# Altium footprint library SAMTEC THD.PcbLib: 161 footprints (part 1 of 12)
Each footprint in its own frame and in the unit in brackets; x right, y up, seen from the top. Pads: shape width x height; smd on the part's side, far side on the other; paste and mask are expansions set on the pad; w line width, h text height; cw(c..) or ccw(c..) is an arc to the next point about the centre after c.
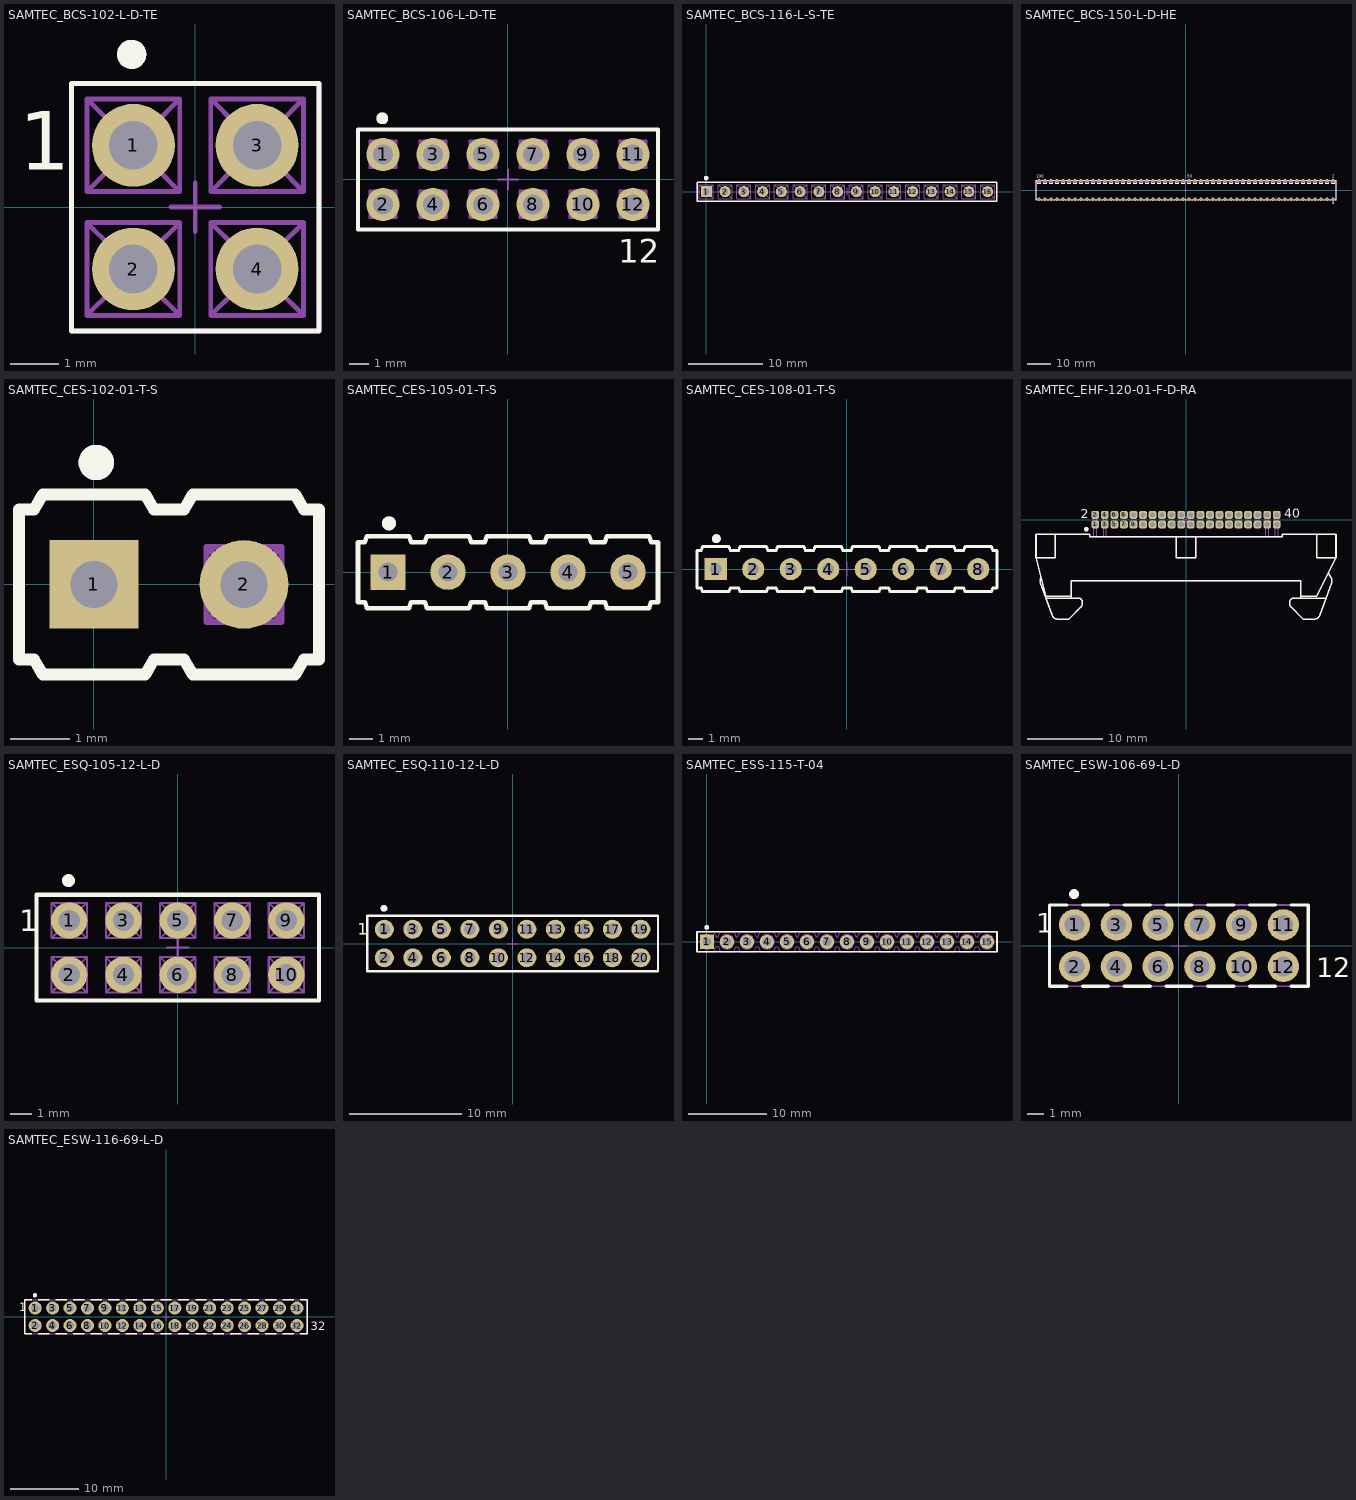
[diagram p0: the footprints below, top view; thin cyan lines are the x and y axes]

## SAMTEC_BCS-102-L-D-TE [mm] "4 Contacts - Pitch 2.54mm - Dual Row Horizontal Entry Socket"
height 7.37
pads (4):
  round 1.7 hole 1: 1(-1.27,1.27) 2(-1.27,-1.27) 3(1.27,1.27) 4(1.27,-1.27)
Top Overlay:
  circle w0.3: c-1.305,3.135 r0.15
  lines w0.1: -2.54,-2.54 -2.54,2.54 2.54,2.54 2.54,-2.54 -2.54,-2.54
  text "1" at -3.617,0.772 h1.2
Mechanical 8:
  lines w0.1: -1.77,-1.27 -1.27,-1.27 ; -1.77,1.27 -1.27,1.27 ; -1.27,-1.77 -1.27,-1.27 ; -1.27,-0.77 -1.27,-1.27 ; -1.27,0.77 -1.27,1.27 ; -1.27,1.77 -1.27,1.27 ; -0.77,-1.27 -1.27,-1.27 ; -0.77,1.27 -1.27,1.27 ; -0.5,0 0,0 ; 0,-0.5 0,0 ; 0,0.5 0,0 ; 0.5,0 0,0 ; 0.77,-1.27 1.27,-1.27 ; 0.77,1.27 1.27,1.27 ; 1.27,-1.77 1.27,-1.27 ; 1.27,0.77 1.27,1.27 ; 1.27,1.77 1.27,1.27 ; 1.77,-1.27 1.27,-1.27 ; 1.77,1.27 1.27,1.27
Mechanical 14:
  circle w0.3: c-1.305,3.135 r0.15
  lines w0.1: -1.71,-0.83 -1.714,-1.714 ; -1.71,1.71 -1.714,0.826 ; 0.83,-0.83 0.826,-1.714 ; 0.83,1.71 0.826,0.826 ; -2.222,-2.222 -1.714,-1.714 ; -2.222,-2.222 -2.222,-0.318 ; -2.222,-2.222 -0.318,-2.222 ; -2.222,-0.318 -1.714,-0.826 -0.826,-0.826 ; -2.222,-0.318 -0.318,-0.318 ; -2.222,0.318 -1.714,0.826 ; -2.222,0.318 -2.222,2.222 ; -2.222,0.318 -0.318,0.318 ; -2.222,2.222 -1.714,1.714 -0.826,1.714 ; -2.222,2.222 -0.318,2.222 ; -1.714,-1.714 -0.826,-1.714 ; -1.714,0.826 -0.826,0.826 ; -0.826,-1.714 -0.318,-2.222 ; -0.826,-1.714 -0.826,-0.826 ; -0.826,-0.826 -0.318,-0.318 ; -0.826,0.826 -0.318,0.318 ; -0.826,0.826 -0.826,1.714 ; -0.826,1.714 -0.318,2.222 ; -0.318,-2.222 -0.318,-0.318 ; -0.318,0.318 -0.318,2.222 ; 0.318,-2.222 0.826,-1.714 ; 0.318,-2.222 0.318,-0.318 ; 0.318,-2.222 2.222,-2.222 ; 0.318,-0.318 0.826,-0.826 1.714,-0.826 ; 0.318,-0.318 2.222,-0.318 ; 0.318,0.318 0.826,0.826 ; 0.318,0.318 0.318,2.222 ; 0.318,0.318 2.222,0.318 ; 0.318,2.222 0.826,1.714 1.714,1.714 ; 0.318,2.222 2.222,2.222 ; 0.826,-1.714 1.714,-1.714 ; 0.826,0.826 1.714,0.826 ; 1.714,-1.714 2.222,-2.222 ; 1.714,-1.714 1.714,-0.826 ; 1.714,-0.826 2.222,-0.318 ; 1.714,0.826 2.222,0.318 ; 1.714,0.826 1.714,1.714 ; 1.714,1.714 2.222,2.222 ; 2.222,-2.222 2.222,-0.318 ; 2.222,0.318 2.222,2.222 ; -2.54,-2.54 -2.54,2.54 2.54,2.54 2.54,-2.54 -2.54,-2.54
  text "1" at -3.617,0.772 h1.2
3D body "SAMTEC_BCS-102-L-D-TE.stp": height 7.37, standoff -3.1, extent -2.54,-2.54 2.54,2.54

## SAMTEC_BCS-106-L-D-TE [mm] "12 Contacts - Pitch 2.54mm - Dual Row Top Entry Socket"
height 7.37
pads (12):
  round 1.7 hole 1: 1(-6.35,1.27) 2(-6.35,-1.27) 3(-3.81,1.27) 4(-3.81,-1.27) 5(-1.27,1.27) 6(-1.27,-1.27) 7(1.27,1.27) 8(1.27,-1.27) 9(3.81,1.27) 10(3.81,-1.27) 11(6.35,1.27) 12(6.35,-1.27)
Top Overlay:
  circle w0.3: c-6.387,3.108 r0.15
  lines w0.2: -7.62,-2.54 7.62,-2.54 7.62,2.54 -7.62,2.54 -7.62,-2.54
  text "12" at 5.6,-4.225 h1.2
Mechanical 8:
  lines w0.1: -6.85,-1.27 -6.35,-1.27 ; -6.85,1.27 -6.35,1.27 ; -6.35,-1.77 -6.35,-1.27 ; -6.35,-0.77 -6.35,-1.27 ; -6.35,0.77 -6.35,1.27 ; -6.35,1.77 -6.35,1.27 ; -5.85,-1.27 -6.35,-1.27 ; -5.85,1.27 -6.35,1.27 ; -4.31,-1.27 -3.81,-1.27 ; -4.31,1.27 -3.81,1.27 ; -3.81,-1.77 -3.81,-1.27 ; -3.81,-0.77 -3.81,-1.27 ; -3.81,0.77 -3.81,1.27 ; -3.81,1.77 -3.81,1.27 ; -3.31,-1.27 -3.81,-1.27 ; -3.31,1.27 -3.81,1.27 ; -1.77,-1.27 -1.27,-1.27 ; -1.77,1.27 -1.27,1.27 ; -1.27,-1.77 -1.27,-1.27 ; -1.27,-0.77 -1.27,-1.27 ; -1.27,0.77 -1.27,1.27 ; -1.27,1.77 -1.27,1.27 ; -0.77,-1.27 -1.27,-1.27 ; -0.77,1.27 -1.27,1.27 ; -0.5,0 0,0 ; 0,-0.5 0,0 ; 0,0.5 0,0 ; 0.5,0 0,0 ; 0.77,-1.27 1.27,-1.27 ; 0.77,1.27 1.27,1.27 ; 1.27,-1.77 1.27,-1.27 ; 1.27,-0.77 1.27,-1.27 ; 1.27,0.77 1.27,1.27 ; 1.27,1.77 1.27,1.27 ; 1.77,-1.27 1.27,-1.27 ; 1.77,1.27 1.27,1.27 ; 3.31,-1.27 3.81,-1.27 ; 3.31,1.27 3.81,1.27 ; 3.81,-1.77 3.81,-1.27 ; 3.81,-0.77 3.81,-1.27 ; 3.81,0.77 3.81,1.27 ; 3.81,1.77 3.81,1.27 ; 4.31,-1.27 3.81,-1.27 ; 4.31,1.27 3.81,1.27 ; 5.85,-1.27 6.35,-1.27 ; 5.85,1.27 6.35,1.27 ; 6.35,-1.77 6.35,-1.27 ; 6.35,-0.77 6.35,-1.27 ; 6.35,0.77 6.35,1.27 ; 6.35,1.77 6.35,1.27 ; 6.85,-1.27 6.35,-1.27 ; 6.85,1.27 6.35,1.27
Mechanical 14:
  circle w0.3: c-6.387,3.108 r0.15
  lines w0.1: -7.048,-1.968 -5.651,-1.968 ; -7.048,-1.968 -7.048,-0.572 ; -7.048,-1.968 -6.794,-1.714 ; -7.048,-0.572 -5.651,-0.572 ; -7.048,-0.572 -6.794,-0.826 ; -7.048,0.572 -5.651,0.572 ; -7.048,0.572 -7.048,1.968 ; -7.048,0.572 -6.794,0.826 ; -7.048,1.968 -5.651,1.968 ; -7.048,1.968 -6.794,1.714 ; -6.794,-1.714 -6.794,-0.826 ; -6.794,-1.714 -5.905,-1.714 ; -6.794,-0.826 -5.905,-0.826 ; -6.794,0.826 -6.794,1.714 ; -6.794,0.826 -5.905,0.826 ; -6.794,1.714 -5.905,1.714 ; -5.905,-1.714 -5.905,-0.826 ; -5.905,-1.714 -5.651,-1.968 ; -5.905,-0.826 -5.651,-0.572 ; -5.905,0.826 -5.905,1.714 ; -5.905,0.826 -5.651,0.572 ; -5.905,1.714 -5.651,1.968 ; -5.651,-1.968 -5.651,-0.572 ; -5.651,0.572 -5.651,1.968 ; -4.508,-1.968 -3.111,-1.968 ; -4.508,-1.968 -4.508,-0.572 ; -4.508,-1.968 -4.254,-1.714 ; -4.508,-0.572 -3.111,-0.572 ; -4.508,-0.572 -4.254,-0.826 ; -4.508,0.572 -3.111,0.572 ; -4.508,0.572 -4.508,1.968 ; -4.508,0.572 -4.254,0.826 ; -4.508,1.968 -3.111,1.968 ; -4.508,1.968 -4.254,1.714 ; -4.254,-1.714 -4.254,-0.826 ; -4.254,-1.714 -3.365,-1.714 ; -4.254,-0.826 -3.365,-0.826 ; -4.254,0.826 -4.254,1.714 ; -4.254,0.826 -3.365,0.826 ; -4.254,1.714 -3.365,1.714 ; -3.365,-1.714 -3.365,-0.826 ; -3.365,-1.714 -3.111,-1.968 ; -3.365,-0.826 -3.111,-0.572 ; -3.365,0.826 -3.365,1.714 ; -3.365,0.826 -3.111,0.572 ; -3.365,1.714 -3.111,1.968 ; -3.111,-1.968 -3.111,-0.572 ; -3.111,0.572 -3.111,1.968 ; -1.968,-1.968 -0.571,-1.968 ; -1.968,-1.968 -1.968,-0.572 ; -1.968,-1.968 -1.714,-1.714 ; -1.968,-0.572 -0.571,-0.572 ; -1.968,-0.572 -1.714,-0.826 ; -1.968,0.572 -0.571,0.572 ; -1.968,0.572 -1.968,1.968 ; -1.968,0.572 -1.714,0.826 ; -1.968,1.968 -0.571,1.968 ; -1.968,1.968 -1.714,1.714 ; -1.714,-1.714 -1.714,-0.826 ; -1.714,-1.714 -0.825,-1.714 ; -1.714,-0.826 -0.825,-0.826 ; -1.714,0.826 -1.714,1.714 ; -1.714,0.826 -0.825,0.826 ; -1.714,1.714 -0.825,1.714 ; -0.825,-1.714 -0.825,-0.826 ; -0.825,-1.714 -0.571,-1.968 ; -0.825,-0.826 -0.571,-0.572 ; -0.825,0.826 -0.825,1.714 ; -0.825,0.826 -0.571,0.572 ; -0.825,1.714 -0.571,1.968 ; -0.571,-1.968 -0.571,-0.572 ; -0.571,0.572 -0.571,1.968 ; 0.572,-1.968 1.969,-1.968 ; 0.572,-1.968 0.572,-0.572 ; 0.572,-1.968 0.826,-1.714 ; 0.572,-0.572 1.969,-0.572 ; 0.572,-0.572 0.826,-0.826 ; 0.572,0.572 1.969,0.572 ; 0.572,0.572 0.572,1.968 ; 0.572,0.572 0.826,0.826 ; 0.572,1.968 1.969,1.968 ; 0.572,1.968 0.826,1.714 ; 0.826,-1.714 0.826,-0.826 ; 0.826,-1.714 1.715,-1.714 ; 0.826,-0.826 1.715,-0.826 ; 0.826,0.826 0.826,1.714 ; 0.826,0.826 1.715,0.826 ; 0.826,1.714 1.715,1.714 ; 1.715,-1.714 1.715,-0.826 ; 1.715,-1.714 1.969,-1.968 ; 1.715,-0.826 1.969,-0.572 ; 1.715,0.826 1.715,1.714 ; 1.715,0.826 1.969,0.572 ; 1.715,1.714 1.969,1.968 ; 1.969,-1.968 1.969,-0.572 ; 1.969,0.572 1.969,1.968 ; 3.112,-1.968 4.509,-1.968 ; 3.112,-1.968 3.112,-0.572 ; 3.112,-1.968 3.366,-1.714 ; 3.112,-0.572 4.509,-0.572 ; 3.112,-0.572 3.366,-0.826 ; 3.112,0.572 4.509,0.572 ; 3.112,0.572 3.112,1.968 ; 3.112,0.572 3.366,0.826 ; 3.112,1.968 4.509,1.968 ; 3.112,1.968 3.366,1.714 ; 3.366,-1.714 3.366,-0.826 ; 3.366,-1.714 4.255,-1.714 ; 3.366,-0.826 4.255,-0.826 ; 3.366,0.826 3.366,1.714 ; 3.366,0.826 4.255,0.826 ; 3.366,1.714 4.255,1.714 ; 4.255,-1.714 4.255,-0.826 ; 4.255,-1.714 4.509,-1.968 ; 4.255,-0.826 4.509,-0.572 ; 4.255,0.826 4.255,1.714 ; 4.255,0.826 4.509,0.572 ; 4.255,1.714 4.509,1.968 ; 4.509,-1.968 4.509,-0.572 ; 4.509,0.572 4.509,1.968 ; 5.652,-1.968 7.049,-1.968 ; 5.652,-1.968 5.652,-0.572 ; 5.652,-1.968 5.906,-1.714 ; 5.652,-0.572 7.049,-0.572 ; 5.652,-0.572 5.906,-0.826 ; 5.652,0.572 7.049,0.572 ; 5.652,0.572 5.652,1.968 ; 5.652,0.572 5.906,0.826 ; 5.652,1.968 7.049,1.968 ; 5.652,1.968 5.906,1.714 ; 5.906,-1.714 5.906,-0.826 ; 5.906,-1.714 6.795,-1.714 ; 5.906,-0.826 6.795,-0.826 ; 5.906,0.826 5.906,1.714 ; 5.906,0.826 6.795,0.826 ; 5.906,1.714 6.795,1.714 ; 6.795,-1.714 6.795,-0.826 ; 6.795,-1.714 7.049,-1.968 ; 6.795,-0.826 7.049,-0.572 ; 6.795,0.826 6.795,1.714 ; 6.795,0.826 7.049,0.572 ; 6.795,1.714 7.049,1.968 ; 7.049,-1.968 7.049,-0.572 ; 7.049,0.572 7.049,1.968 ; -7.62,-2.54 7.62,-2.54 7.62,2.54 -7.62,2.54 -7.62,-2.54
  text "12" at 5.6,-4.225 h1.2
3D body "SAMTEC_BCS-106-L-D-TE.stp": height 7.37, standoff -3.1, extent -7.62,-2.54 7.62,2.54

## SAMTEC_BCS-116-L-S-TE [mm] "16 Contacts - Pitch 2.54mm - Single Row Vertical Entry Socket"
height 7.37
pads (16):
  rect 1.5x1.5 hole 0.8: 1(0,0)
  round 1.5 hole 0.8: 2(2.54,0) 3(5.08,0) 4(7.62,0) 5(10.16,0) 6(12.7,0) 7(15.24,0) 8(17.78,0) 9(20.32,0) 10(22.86,0) 11(25.4,0) 12(27.94,0) 13(30.48,0) 14(33.02,0) 15(35.56,0) 16(38.1,0)
Top Overlay:
  circle w0.3: c-0.037,1.838 r0.15
  lines w0.2: -1.27,-1.27 -1.27,1.27 39.37,1.27 39.37,-1.27 -1.27,-1.27
Mechanical 8:
  lines w0.1: -0.5,0 0,0 ; 0,-0.5 0,0 ; 0,0.5 0,0 ; 0.5,0 0,0 ; 2.04,0 2.54,0 ; 2.54,-0.5 2.54,0 ; 2.54,0.5 2.54,0 ; 3.04,0 2.54,0 ; 4.58,0 5.08,0 ; 5.08,-0.5 5.08,0 ; 5.08,0.5 5.08,0 ; 5.58,0 5.08,0 ; 7.12,0 7.62,0 ; 7.62,-0.5 7.62,0 ; 7.62,0.5 7.62,0 ; 8.12,0 7.62,0 ; 9.66,0 10.16,0 ; 10.16,-0.5 10.16,0 ; 10.16,0.5 10.16,0 ; 10.66,0 10.16,0 ; 12.2,0 12.7,0 ; 12.7,-0.5 12.7,0 ; 12.7,0.5 12.7,0 ; 13.2,0 12.7,0 ; 14.74,0 15.24,0 ; 15.24,-0.5 15.24,0 ; 15.24,0.5 15.24,0 ; 15.74,0 15.24,0 ; 17.28,0 17.78,0 ; 17.78,-0.5 17.78,0 ; 17.78,0.5 17.78,0 ; 18.28,0 17.78,0 ; 18.55,0 19.05,0 ; 19.05,-0.5 19.05,0 ; 19.05,0.5 19.05,0 ; 19.55,0 19.05,0 ; 19.82,0 20.32,0 ; 20.32,-0.5 20.32,0 ; 20.32,0.5 20.32,0 ; 20.82,0 20.32,0 ; 22.36,0 22.86,0 ; 22.86,-0.5 22.86,0 ; 22.86,0.5 22.86,0 ; 23.36,0 22.86,0 ; 24.9,0 25.4,0 ; 25.4,-0.5 25.4,0 ; 25.4,0.5 25.4,0 ; 25.9,0 25.4,0 ; 27.44,0 27.94,0 ; 27.94,-0.5 27.94,0 ; 27.94,0.5 27.94,0 ; 28.44,0 27.94,0 ; 29.98,0 30.48,0 ; 30.48,-0.5 30.48,0 ; 30.48,0.5 30.48,0 ; 30.98,0 30.48,0 ; 32.52,0 33.02,0 ; 33.02,-0.5 33.02,0 ; 33.02,0.5 33.02,0 ; 33.52,0 33.02,0 ; 35.06,0 35.56,0 ; 35.56,-0.5 35.56,0 ; 35.56,0.5 35.56,0 ; 36.06,0 35.56,0 ; 37.6,0 38.1,0 ; 38.1,-0.5 38.1,0 ; 38.1,0.5 38.1,0 ; 38.6,0 38.1,0
Mechanical 14:
  drawing of 181 lines, arcs and shapes, not listed
3D body "SAMTEC_BCS-116-L-S-TE.stp": height 7.37, standoff -3.1, extent -1.27,-1.27 39.37,1.27

## SAMTEC_BCS-150-L-D-HE [mm] "100 Contacts - Pitch 2.54mm - Dual Row Horizontal Entry Socket"
height 5.72
pads (100):
  round 1.5 hole 0.8: 1(62.23,-3.935) 2(62.23,3.935) 3(59.69,-3.935) 4(59.69,3.935) 5(57.15,-3.935) 6(57.15,3.935) 7(54.61,-3.935) 8(54.61,3.935) 9(52.07,-3.935) 10(52.07,3.935) 11(49.53,-3.935) 12(49.53,3.935) 13(46.99,-3.935) 14(46.99,3.935) 15(44.45,-3.935) 16(44.45,3.935) 17(41.91,-3.935) 18(41.91,3.935) 19(39.37,-3.935) 20(39.37,3.935) 21(36.83,-3.935) 22(36.83,3.935) 23(34.29,-3.935) 24(34.29,3.935) 25(31.75,-3.935) 26(31.75,3.935) 27(29.21,-3.935) 28(29.21,3.935) 29(26.67,-3.935) 30(26.67,3.935) 31(24.13,-3.935) 32(24.13,3.935) 33(21.59,-3.935) 34(21.59,3.935) 35(19.05,-3.935) 36(19.05,3.935) 37(16.51,-3.935) 38(16.51,3.935) 39(13.97,-3.935) 40(13.97,3.935) 41(11.43,-3.935) 42(11.43,3.935) 43(8.89,-3.935) 44(8.89,3.935) 45(6.35,-3.935) 46(6.35,3.935) 47(3.81,-3.935) 48(3.81,3.935) 49(1.27,-3.935) 50(1.27,3.935) 51(-1.27,-3.935) 52(-1.27,3.935) 53(-3.81,-3.935) 54(-3.81,3.935) 55(-6.35,-3.935) 56(-6.35,3.935) 57(-8.89,-3.935) 58(-8.89,3.935) 59(-11.43,-3.935) 60(-11.43,3.935) 61(-13.97,-3.935) 62(-13.97,3.935) 63(-16.51,-3.935) 64(-16.51,3.935) 65(-19.05,-3.935) 66(-19.05,3.935) 67(-21.59,-3.935) 68(-21.59,3.935) 69(-24.13,-3.935) 70(-24.13,3.935) 71(-26.67,-3.935) 72(-26.67,3.935) 73(-29.21,-3.935) 74(-29.21,3.935) 75(-31.75,-3.935) 76(-31.75,3.935) 77(-34.29,-3.935) 78(-34.29,3.935) 79(-36.83,-3.935) 80(-36.83,3.935) 81(-39.37,-3.935) 82(-39.37,3.935) 83(-41.91,-3.935) 84(-41.91,3.935) 85(-44.45,-3.935) 86(-44.45,3.935) 87(-46.99,-3.935) 88(-46.99,3.935) 89(-49.53,-3.935) 90(-49.53,3.935) 91(-52.07,-3.935) 92(-52.07,3.935) 93(-54.61,-3.935) 94(-54.61,3.935) 95(-57.15,-3.935) 96(-57.15,3.935) 97(-59.69,-3.935) 98(-59.69,3.935) 99(-62.23,-3.935) 100(-62.23,3.935)
Top Overlay:
  drawing of 257 lines, arcs and shapes, not listed
  text "50" at 0.5,5.175 h1.2
  text "100" at -63.375,5.136 h1.2
  text "2" at 61.86,5.175 h1.2
Mechanical 8:
  drawing of 405 lines, arcs and shapes, not listed
Mechanical 14:
  drawing of 308 lines, arcs and shapes, not listed
  text "50" at 0.5,5.175 h1.2
  text "100" at -63.375,5.136 h1.2
  text "2" at 61.86,5.175 h1.2
3D body "SAMTEC_BCS-150-L-D-HE.stp": height 5.72, standoff -3.1, extent -63.5,-4.064 63.5,4.064

## SAMTEC_CES-102-01-T-S [mm] "2 Contacts - Pitch 2.54mm - Single Row Through Mount Straigh Socket (Lead Length 3.25mm)"
height 4.57
pads (2):
  rect 1.5x1.5 hole 0.8: 1(0,0)
  round 1.5 hole 0.8: 2(2.54,0)
Top Overlay:
  circle w0.3: c0.04,2.065 r0.15
  lines w0.2: -1.27,-1.269 -1.27,1.271 -1.016,1.271 -0.869,1.525 0.869,1.525 1.016,1.271 1.27,1.271 1.524,1.271 1.671,1.525 3.409,1.525 3.556,1.271 3.81,1.271 3.81,-1.269 3.556,-1.269 3.409,-1.523 1.671,-1.523 1.524,-1.269 1.27,-1.269 1.016,-1.269 0.869,-1.523 -0.869,-1.523 -1.016,-1.269 -1.27,-1.269
Mechanical 8:
  lines w0.1: -0.5,0 0,0 ; 0,-0.5 0,0 ; 0,0.5 0,0 ; 0.5,0 0,0 ; 2.04,0 2.54,0 ; 2.54,-0.5 2.54,0 ; 2.54,0.5 2.54,0 ; 3.04,0 2.54,0
Mechanical 14:
  circle w0.3: c0.04,2.065 r0.15
  lines w0.1: -0.635,-0.634 0.635,-0.634 ; -0.635,-0.634 -0.635,0.636 ; -0.635,-0.634 -0.381,-0.38 ; -0.635,0.636 0.635,0.636 ; -0.635,0.636 -0.381,0.382 ; -0.381,-0.38 -0.381,0.382 ; -0.381,-0.38 0.381,-0.38 ; -0.381,0.382 0.381,0.382 ; 0.381,-0.38 0.635,-0.634 ; 0.381,-0.38 0.381,0.382 ; 0.381,0.382 0.635,0.636 ; 0.635,-0.634 0.635,0.636 ; 1.905,-0.634 2.159,-0.38 ; 1.905,-0.634 3.175,-0.634 ; 1.905,-0.634 1.905,0.636 ; 1.905,0.636 2.159,0.382 ; 1.905,0.636 3.175,0.636 ; 2.159,-0.38 2.159,0.382 ; 2.159,-0.38 2.921,-0.38 ; 2.159,0.382 2.921,0.382 ; 2.921,-0.38 3.175,-0.634 ; 2.921,-0.38 2.921,0.382 ; 2.921,0.382 3.175,0.636 ; 3.175,-0.634 3.175,0.636 ; -1.27,-1.269 -1.27,1.271 -1.016,1.271 -0.869,1.525 0.869,1.525 1.016,1.271 1.27,1.271 1.524,1.271 1.671,1.525 3.409,1.525 3.556,1.271 3.81,1.271 3.81,-1.269 3.556,-1.269 3.409,-1.523 1.671,-1.523 1.524,-1.269 1.27,-1.269 1.016,-1.269 0.869,-1.523 -0.869,-1.523 -1.016,-1.269 -1.27,-1.269
3D body "SAMTEC_CES-102-01-T-S.stp": height 5.08, standoff -5.08, extent -1.27,-1.525 3.81,1.525

## SAMTEC_CES-105-01-T-S [mm] "5 Contacts - Pitch 2.54mm - Single Row Through Mount Straigh Socket (Lead Length 3.25mm)"
height 5.08
pads (5):
  rect 1.5x1.5 hole 0.8: 1(-5.08,0)
  round 1.5 hole 0.8: 2(-2.54,0) 3(0,0) 4(2.54,0) 5(5.08,0)
Top Overlay:
  circle w0.3: c-5.04,2.065 r0.15
  lines w0.2: -6.35,-1.27 -6.061,-1.27 -5.969,-1.524 -4.191,-1.524 -4.098,-1.27 -3.521,-1.27 -3.429,-1.524 -1.651,-1.524 -1.558,-1.27 -0.981,-1.27 -0.889,-1.524 0.889,-1.524 0.982,-1.27 1.559,-1.27 1.651,-1.524 3.429,-1.524 3.522,-1.27 4.099,-1.27 4.191,-1.524 5.969,-1.524 6.062,-1.27 6.35,-1.27 6.35,1.27 6.062,1.27 5.969,1.524 4.191,1.524 4.099,1.27 3.522,1.27 3.429,1.524 1.651,1.524 1.559,1.27 0.982,1.27 0.889,1.524 -0.889,1.524 -0.981,1.27 -1.558,1.27 -1.651,1.524 -3.429,1.524 -3.521,1.27 -4.098,1.27 -4.191,1.524 -5.969,1.524 -6.061,1.27 -6.35,1.27 -6.35,-1.27
Mechanical 8:
  lines w0.05: -5.58,0 -5.08,0 ; -5.08,-0.5 -5.08,0 ; -5.08,0.5 -5.08,0 ; -4.58,0 -5.08,0 ; -3.04,0 -2.54,0 ; -2.54,-0.5 -2.54,0 ; -2.54,0.5 -2.54,0 ; -2.04,0 -2.54,0 ; -0.5,0 0,0 ; 0,-0.5 0,0 ; 0,0.5 0,0 ; 0.5,0 0,0 ; 2.04,0 2.54,0 ; 2.54,-0.5 2.54,0 ; 2.54,0.5 2.54,0 ; 3.04,0 2.54,0 ; 4.58,0 5.08,0 ; 5.08,-0.5 5.08,0 ; 5.08,0.5 5.08,0 ; 5.58,0 5.08,0
Mechanical 14:
  circle w0.3: c-5.04,2.065 r0.15
  lines w0.1: 6.35,-1.27 6.062,-1.27 5.969,-1.524 4.191,-1.524 4.099,-1.27 3.522,-1.27 3.429,-1.524 1.651,-1.524 1.559,-1.27 0.982,-1.27 0.889,-1.524 -0.889,-1.524 -0.981,-1.27 -1.558,-1.27 -1.651,-1.524 -3.429,-1.524 -3.521,-1.27 -4.098,-1.27 -4.191,-1.524 -5.969,-1.524 -6.061,-1.27 -6.35,-1.27 -6.35,1.27 -6.061,1.27 -5.969,1.524 -4.191,1.524 -4.098,1.27 -3.521,1.27 -3.429,1.524 -1.651,1.524 -1.558,1.27 -0.981,1.27 -0.889,1.524 0.889,1.524 0.982,1.27 1.559,1.27 1.651,1.524 3.429,1.524 3.522,1.27 4.099,1.27 4.191,1.524 5.969,1.524 6.062,1.27 6.35,1.27 ; -5.436,-0.356 -5.436,0.356 -4.724,0.356 -4.724,-0.356 -5.436,-0.356 ; -2.896,-0.356 -2.896,0.356 -2.184,0.356 -2.184,-0.356 -2.896,-0.356 ; -0.356,-0.356 -0.356,0.356 0.356,0.356 0.356,-0.356 -0.356,-0.356 ; 2.184,-0.356 2.184,0.356 2.896,0.356 2.896,-0.356 2.184,-0.356 ; 4.724,-0.356 4.724,0.356 5.436,0.356 5.436,-0.356 4.724,-0.356
3D body "SAMTEC_CES-105-01-T-S.stp": height 5.08, standoff -3.25, extent -6.35,-1.524 6.35,1.524

## SAMTEC_CES-108-01-T-S [mm] "8 Contacts - Pitch 2.54mm - Single Row Through Mount Straigh Socket (Lead Length 3.25mm)"
height 5.08
pads (8):
  rect 1.5x1.5 hole 0.8: 1(-8.89,0)
  round 1.5 hole 0.8: 2(-6.35,0) 3(-3.81,0) 4(-1.27,0) 5(1.27,0) 6(3.81,0) 7(6.35,0) 8(8.89,0)
Top Overlay:
  circle w0.3: c-8.85,2.065 r0.15
  lines w0.2: -10.16,-1.27 -10.16,1.27 -9.871,1.27 -9.779,1.524 -8.001,1.524 -7.908,1.27 -7.331,1.27 -7.239,1.524 -5.461,1.524 -5.368,1.27 -4.791,1.27 -4.699,1.524 -2.921,1.524 -2.828,1.27 -2.251,1.27 -2.159,1.524 -0.381,1.524 -0.288,1.27 0.289,1.27 0.381,1.524 2.159,1.524 2.252,1.27 2.829,1.27 2.921,1.524 4.699,1.524 4.792,1.27 5.369,1.27 5.461,1.524 7.239,1.524 7.332,1.27 7.909,1.27 8.001,1.524 9.779,1.524 9.872,1.27 10.16,1.27 10.16,-1.27 9.872,-1.27 9.779,-1.524 8.001,-1.524 7.909,-1.27 7.332,-1.27 7.239,-1.524 5.461,-1.524 5.369,-1.27 4.792,-1.27 4.699,-1.524 2.921,-1.524 2.829,-1.27 2.252,-1.27 2.159,-1.524 0.381,-1.524 0.289,-1.27 -0.288,-1.27 -0.381,-1.524 -2.159,-1.524 -2.251,-1.27 -2.828,-1.27 -2.921,-1.524 -4.699,-1.524 -4.791,-1.27 -5.368,-1.27 -5.461,-1.524 -7.239,-1.524 -7.331,-1.27 -7.908,-1.27 -8.001,-1.524 -9.779,-1.524 -9.871,-1.27 -10.16,-1.27
Mechanical 8:
  lines w0.05: -9.39,0 -8.89,0 ; -8.89,-0.5 -8.89,0 ; -8.89,0.5 -8.89,0 ; -8.39,0 -8.89,0 ; -6.85,0 -6.35,0 ; -6.35,-0.5 -6.35,0 ; -6.35,0.5 -6.35,0 ; -5.85,0 -6.35,0 ; -4.31,0 -3.81,0 ; -3.81,-0.5 -3.81,0 ; -3.81,0.5 -3.81,0 ; -3.31,0 -3.81,0 ; -1.77,0 -1.27,0 ; -1.27,-0.5 -1.27,0 ; -1.27,0.5 -1.27,0 ; -0.77,0 -1.27,0 ; -0.5,0 0,0 ; 0,-0.5 0,0 ; 0,0.5 0,0 ; 0.5,0 0,0 ; 0.77,0 1.27,0 ; 1.27,-0.5 1.27,0 ; 1.27,0.5 1.27,0 ; 1.77,0 1.27,0 ; 3.31,0 3.81,0 ; 3.81,-0.5 3.81,0 ; 3.81,0.5 3.81,0 ; 4.31,0 3.81,0 ; 5.85,0 6.35,0 ; 6.35,-0.5 6.35,0 ; 6.35,0.5 6.35,0 ; 6.85,0 6.35,0 ; 8.39,0 8.89,0 ; 8.89,-0.5 8.89,0 ; 8.89,0.5 8.89,0 ; 9.39,0 8.89,0
Mechanical 14:
  circle w0.3: c-8.85,2.065 r0.15
  lines w0.1: -10.16,-1.27 -10.16,1.27 -9.871,1.27 -9.779,1.524 -8.001,1.524 -7.908,1.27 -7.331,1.27 -7.239,1.524 -5.461,1.524 -5.368,1.27 -4.791,1.27 -4.699,1.524 -2.921,1.524 -2.828,1.27 -2.251,1.27 -2.159,1.524 -0.381,1.524 -0.288,1.27 0.289,1.27 0.381,1.524 2.159,1.524 2.252,1.27 2.829,1.27 2.921,1.524 4.699,1.524 4.792,1.27 5.369,1.27 5.461,1.524 7.239,1.524 7.332,1.27 7.909,1.27 8.001,1.524 9.779,1.524 9.872,1.27 10.16,1.27 10.16,-1.27 9.872,-1.27 9.779,-1.524 8.001,-1.524 7.909,-1.27 7.332,-1.27 7.239,-1.524 5.461,-1.524 5.369,-1.27 4.792,-1.27 4.699,-1.524 2.921,-1.524 2.829,-1.27 2.252,-1.27 2.159,-1.524 0.381,-1.524 0.289,-1.27 -0.288,-1.27 -0.381,-1.524 -2.159,-1.524 -2.251,-1.27 -2.828,-1.27 -2.921,-1.524 -4.699,-1.524 -4.791,-1.27 -5.368,-1.27 -5.461,-1.524 -7.239,-1.524 -7.331,-1.27 -7.908,-1.27 -8.001,-1.524 -9.779,-1.524 -9.871,-1.27 -10.16,-1.27 ; -9.246,-0.356 -8.534,-0.356 -8.534,0.356 -9.246,0.356 -9.246,-0.356 ; -6.706,-0.356 -5.994,-0.356 -5.994,0.356 -6.706,0.356 -6.706,-0.356 ; -4.166,-0.356 -3.454,-0.356 -3.454,0.356 -4.166,0.356 -4.166,-0.356 ; -1.626,-0.356 -0.914,-0.356 -0.914,0.356 -1.626,0.356 -1.626,-0.356 ; 0.914,-0.356 1.626,-0.356 1.626,0.356 0.914,0.356 0.914,-0.356 ; 3.454,-0.356 4.166,-0.356 4.166,0.356 3.454,0.356 3.454,-0.356 ; 5.994,-0.356 6.706,-0.356 6.706,0.356 5.994,0.356 5.994,-0.356 ; 8.534,-0.356 9.246,-0.356 9.246,0.356 8.534,0.356 8.534,-0.356
3D body "SAMTEC_CES-108-01-T-S.stp": height 5.08, standoff -3.25, extent -10.16,-1.524 10.16,1.524
